# Altium integrated library Standardbauteile.IntLib: 132 symbols
Pins are listed as number, name and electrical type; pins without a type are passive.

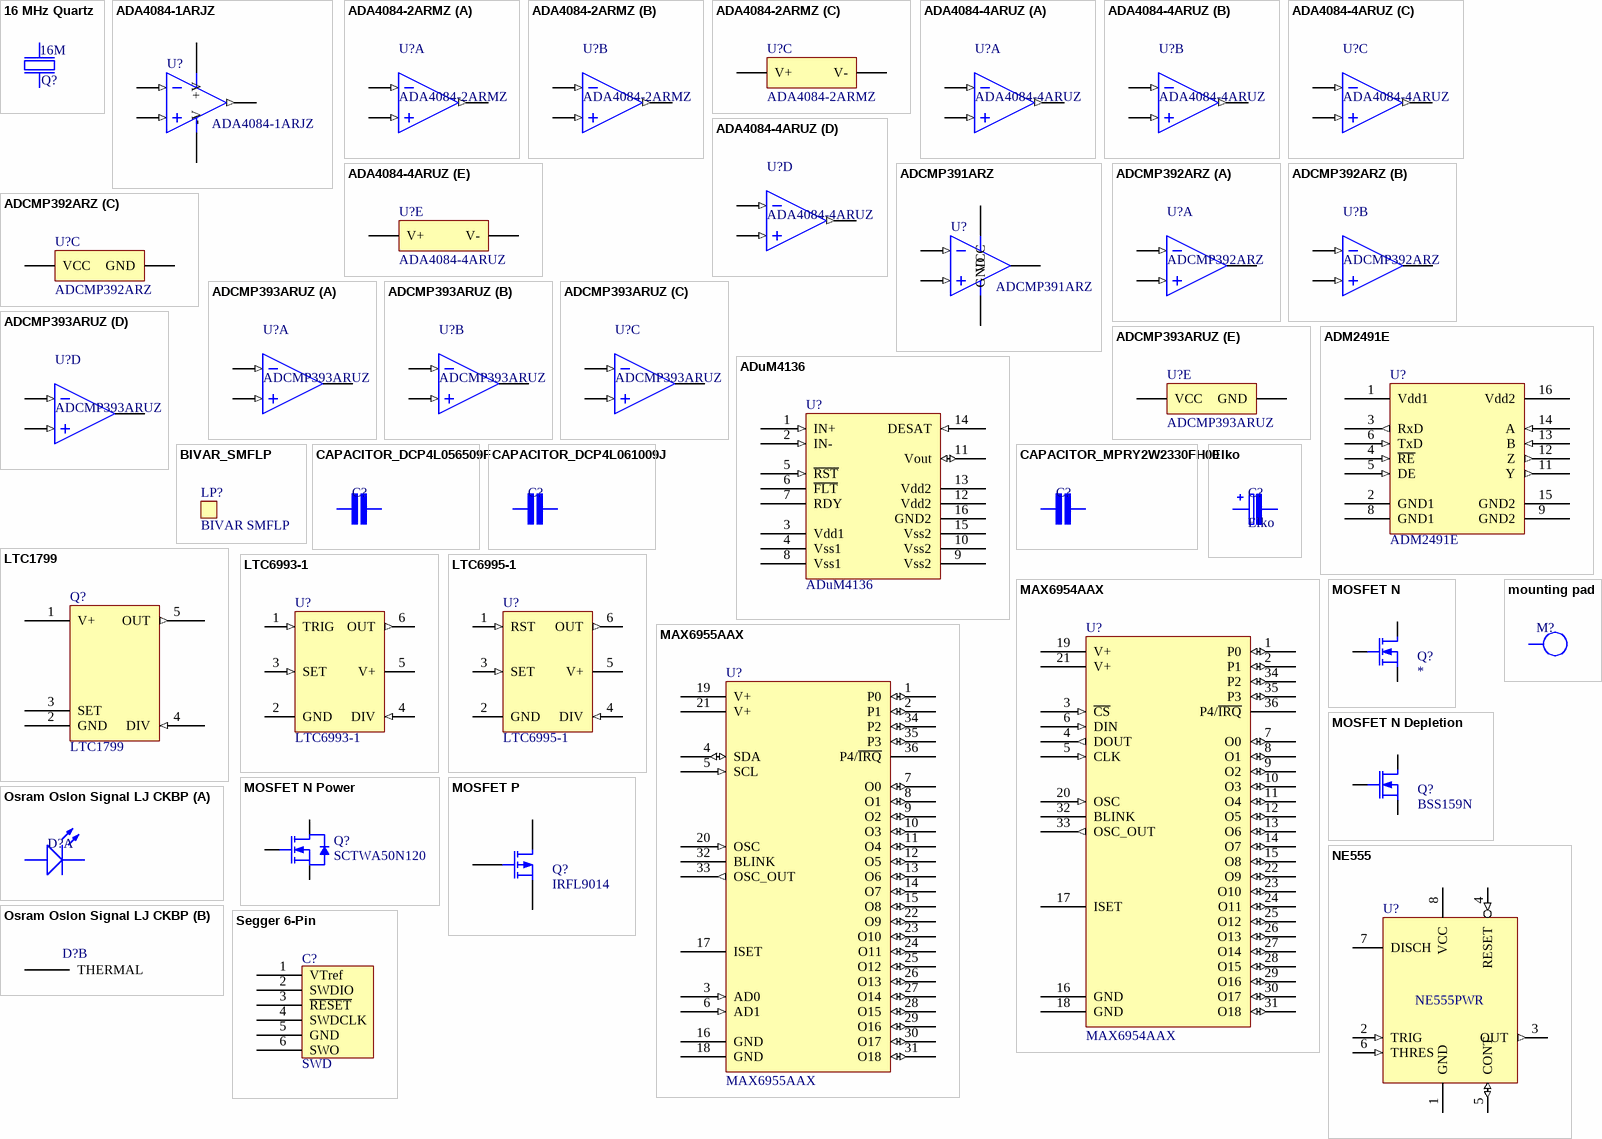
[diagram p0: symbols 16 MHz Quartz to Segger 6-Pin]

## 16 MHz Quartz
designator Q?, comment 16M
16 MHz Quartz
footprint NDK NX5032GA (Crystal, 2-Leads, Body 5.00x3.20mm, IPC Medium Density)
pins: 1, 2

## ADA4084-1ARJZ
designator U?
30 V, Low Noise, Rail-to-Rail Input/Output, Low Power Operational Amplifiers
footprint SOT-23-5-PIN
pins: 1 OUT (out), 2 -V (power), 3 +IN (in), 4 -IN (in), 5 +V (power)

## ADA4084-2ARMZ
designator U?
30 V, Low Noise, Rail-to-Rail Input/Output, Low Power Operational Amplifiers
footprint ANALOG_RM8 (Analog Devices 8-Lead Mini Small Outline Package)
part A pins: 1 OUT_A (out), 2 -IN_A (in), 3 +IN_A (in)
part B pins: 5 +IN_B (in), 6 -IN_B (in), 7 OUT_B (out)
part C pins: 4 V- (power), 8 V+ (power)

## ADA4084-4ARUZ
designator U?
30 V, Low Noise, Rail-to-Rail Input/Output, Low Power Operational Amplifiers
footprint ANALOG_RU14 (Analog Devices 14-Lead Thin Shrink Small Outline Package [TSSOP])
part A pins: 1 OUT_A (out), 2 -IN_A (in), 3 +IN_A (in)
part B pins: 5 +IN_B (in), 6 -IN_B (in), 7 OUT_B (out)
part C pins: 8 OUT_C (out), 9 -IN_C (in), 10 +IN_C (in)
part D pins: 12 +IN_D (in), 13 -IN_D (in), 14 OUT_D (out)
part E pins: 4 V+ (power), 11 V- (power)

## ADCMP391ARZ
designator U?
2.3V-5.5V Single Comparator With Known Power-Up State and Open-Drain output
footprint ANALOG_R8 (Analog Devices 8-Lead Standard Small Outline Package [SOIC_N])
pins: 2 -IN (in), 3 +IN (in), 4 GND (power), 6 OUT (oc), 7 VCC (power)

## ADCMP392ARZ
designator U?
2.3V-5.5V Dual Comparator With Known Power-Up State and Open-Drain outputs
footprint ANALOG_R8 (Analog Devices 8-Lead Standard Small Outline Package [SOIC_N])
part A pins: 1 OUT_A (oc), 2 -IN_A (in), 3 +IN_A (in)
part B pins: 5 +IN_B (in), 6 -IN_B (in), 7 OUT_B (oc)
part C pins: 4 GND (power), 8 VCC (power)

## ADCMP393ARUZ
designator U?
2.3V-5.5V Quad Comparator With Known Power-Up State and Open-Drain output
footprint ANALOG_RU14 (Analog Devices 14-Lead Thin Shrink Small Outline Package [TSSOP])
part A pins: 2 OUT_A (oc), 4 -IN_A (in), 5 +IN_A (in)
part B pins: 1 OUT_B (oc), 6 -IN_B (in), 7 +IN_B (in)
part C pins: 8 -IN_C (in), 9 +IN_C (in), 14 OUT_C (oc)
part D pins: 10 -IN_D (in), 11 +IN_D (in), 13 OUT_D (oc)
part E pins: 3 VCC (power), 12 GND (power)

## ADM2491E
designator U?
footprint SOIC16 (SOIC, 16-Leads, Body 10,30x7,50mm, Pitch 1,27mm, IPC Medium Density)
pins: 1 Vdd1 (power), 2 GND1 (power), 3 RxD (out), 4 ~{RE} (in), 5 DE (in), 6 TxD (in), 8 GND1 (power), 9 GND2 (power), 11 Y (out), 12 Z (out), 13 B (in), 14 A (in), 15 GND2 (power), 16 Vdd2 (power)

## ADuM4136
designator U?
footprint SOIC16 (SOIC, 16-Leads, Body 10,30x7,50mm, Pitch 1,27mm, IPC Medium Density)
pins: 1 IN+ (in), 2 IN- (in), 3 Vdd1 (power), 4 Vss1 (power), 5 ~{RST} (in), 6 ~{FLT} (oc), 7 RDY (oc), 8 Vss1 (power), 9 Vss2 (power), 10 Vss2 (power), 11 Vout (io), 12 Vdd2 (power), 13 Vdd2 (power), 14 DESAT (in), 15 Vss2 (power), 16 GND2 (power)

## BIVAR_SMFLP
designator LP?, comment BIVAR SMFLP  (mechanical)
footprint BIVAR_SMFLP (SMD flexible lightpipe)

## CAPACITOR_DCP4L056509F
designator C?, comment DCP4L056509F  (value not drawn)
WIMA MKP4 Capacitor 800V 65uF; Value: 65u; Datasheet: https://www.wima.de/wp-content/uploads/media/d_WIMA_DC_Link_MKP_4.pdf
footprint CAPACITOR_DCP4L056509F (WIMA MKP4 Capacitor)
pins: 1, 2

## CAPACITOR_DCP4L061009J
designator C?, comment DCP4L061009J  (value not drawn)
WIMA MKP4 Capacitor 800V 100uF; Value: 100u; Datasheet: https://www.wima.de/wp-content/uploads/media/d_WIMA_DC_Link_MKP_4.pdf
footprint CAPACITOR_DCP4L061009J (WIMA MKP4 Capacitor)
pins: 1, 2

## CAPACITOR_MPRY2W2330FH00
designator C?, comment MPRY2W2330FH00  (value not drawn)
WIMA MP 3-Y2 Capacitor 300V 22nF; Value: 22n; Datasheet: https://www.wima.de/wp-content/uploads/media/d_WIMA_MP_3-Y2_3R-Y2.pdf
footprint CAPACITOR_MPRY2W2330FH00 (WIMA MP3-Y2 Capacitor)
pins: 1, 2

## Elko
designator C?
footprint CAP ALUM 6.6MM (Aluminum Electrolytic Capacitor, Body 6.60x6.60x7.70mm, IPC Low Density)
footprint CAP ALUM 8.3MM (Aluminum Electrolytic Capacitor, Body 8.30x8.30x10.50mm, IPC Low Density)
footprint CAP ALUM 10.3MM (Aluminum Electrolytic Capacitor, Body 10.30x10.30x10.50mm, IPC Low Density)
pins: 1, 2

## LTC1799
designator Q?
1kHz to 3MHz Resistor Set Oscillator
footprint SOT-23-5-PIN
pins: 1 V+ (power), 2 GND (power), 3 SET (oc), 4 DIV (in), 5 OUT (out)

## LTC6993-1
designator U?
Monostable Pulse Generator (Rising Edge, No Retrigger)
footprint LT-S6-6-TSOT-23_L (SOT23, 6-Leads, Body 2.90x1.63mm, Pitch 0.95mm, IPC High Density)
pins: 1 TRIG (in) "Trigger Input. Depending on the version, a rising orfalling edge on TRIGwill initiate the output pulse.", 2 GND (power) "Ground. Tie to a lowinductance ground plane for best performance.", 3 SET (in) "Pulse Width Setting Input. The voltage on the SET pin (VSET) is regulated to 1V above GND. The amount of current sourced from the SET pin (ISET) programs the master oscillator frequency", 4 DIV (in) "Programmable Divider and Polarity Input. The DIV pin voltage (VDIV) is internally converted into a 4-bit result (DIVCODE). VDIV may be generated by a resistor divider between V+ and GND. Use 1% resistors to ensure an accurate result. The DIV pin and resistors should be shielded from the OUT pin or any other traces that have fast edges. Limit the capacitance on the DIV pin to less than 100pF so that VDIV settles quickly. The MSB of DIVCODE (POL) determines the polarity of the OUT pins. When POL = 0 the output produces a positive pulse. When POL = 1 the output produces a negative pulse.", 5 V+ (power) "SupplyVoltage (2.25Vto 5.5V). This supply should be kept free from noise and ripple. It should be bypassed directly to the GND pin with a 0.1uF capacitor.", 6 OUT (out) "Output. The OUT pin swings from GND to V+ with an output resistance of approximately 30Ohm. When driving an LED or other low impedance load a series output resistor should be used to limit source/sink current to 20mA."

## LTC6995-1
designator U?
Low Frequency Oscillator (active high RST)
footprint LT-S6-6-TSOT-23_L (SOT23, 6-Leads, Body 2.90x1.63mm, Pitch 0.95mm, IPC High Density)
pins: 1 RST (in) "Trigger Input. Depending on the version, a rising orfalling edge on TRIGwill initiate the output pulse.", 2 GND (power) "Ground. Tie to a lowinductance ground plane for best performance.", 3 SET (in) "Pulse Width Setting Input. The voltage on the SET pin (VSET) is regulated to 1V above GND. The amount of current sourced from the SET pin (ISET) programs the master oscillator frequency", 4 DIV (in) "Programmable Divider and Polarity Input. The DIV pin voltage (VDIV) is internally converted into a 4-bit result (DIVCODE). VDIV may be generated by a resistor divider between V+ and GND. Use 1% resistors to ensure an accurate result. The DIV pin and resistors should be shielded from the OUT pin or any other traces that have fast edges. Limit the capacitance on the DIV pin to less than 100pF so that VDIV settles quickly. The MSB of DIVCODE (POL) determines the polarity of the OUT pins. When POL = 0 the output produces a positive pulse. When POL = 1 the output produces a negative pulse.", 5 V+ (power) "SupplyVoltage (2.25Vto 5.5V). This supply should be kept free from noise and ripple. It should be bypassed directly to the GND pin with a 0.1uF capacitor.", 6 OUT (out) "Output. The OUT pin swings from GND to V+ with an output resistance of approximately 30Ohm. When driving an LED or other low impedance load a series output resistor should be used to limit source/sink current to 20mA."

## MAX6954AAX
designator U?
4-Wire Interfaced, 2.7V to 5.5V / LED Display Driver with I/O / Expander and Key Scan; ComponentLink1Description: Datasheet; ComponentLink1URL: https://datasheets.maximintegrated.com/en/ds/MAX6954.pdf; ComponentLink2Description: Website; ComponentLink2URL: https://www.maximintegrated.com/en/products/power/display-power-control/MAX6954.html
footprint MAXIM_36_SSOP (Maxim Integrated A36-2  36 SSOP)
pins: 1 P0 (io), 2 P1 (io), 3 ~{CS} (in), 4 DOUT (out), 5 CLK (in), 6 DIN (in), 7 O0 (io), 8 O1 (io), 9 O2 (io), 10 O3 (io), 11 O4 (io), 12 O5 (io), 13 O6 (io), 14 O7 (io), 15 O8 (io), 16 GND (power), 17 ISET (oe), 18 GND (power), 19 V+ (power), 20 OSC (in), 21 V+ (power), 22 O9 (io), 23 O10 (io), 24 O11 (io), 25 O12 (io), 26 O13 (io), 27 O14 (io), 28 O15 (io), 29 O16 (io), 30 O17 (io), 31 O18 (io), 32 BLINK (oc), 33 OSC_OUT (out), 34 P2 (io), 35 P3 (io), 36 P4/~{IRQ} (oc)

## MAX6955AAX
designator U?
2-Wire Interfaced, 2.7V to 5.5V / LED Display Driver with I/O / Expander and Key Scan; ComponentLink1Description: Datasheet; ComponentLink1URL: https://datasheets.maximintegrated.com/en/ds/MAX6955.pdf; ComponentLink2Description: Website; ComponentLink2URL: https://www.maximintegrated.com/en/products/power/display-power-control/MAX6955.html
footprint MAXIM_36_SSOP (Maxim Integrated A36-2  36 SSOP)
pins: 1 P0 (io), 2 P1 (io), 3 AD0 (in), 4 SDA (io), 5 SCL (in), 6 AD1 (in), 7 O0 (io), 8 O1 (io), 9 O2 (io), 10 O3 (io), 11 O4 (io), 12 O5 (io), 13 O6 (io), 14 O7 (io), 15 O8 (io), 16 GND (power), 17 ISET (oe), 18 GND (power), 19 V+ (power), 20 OSC (in), 21 V+ (power), 22 O9 (io), 23 O10 (io), 24 O11 (io), 25 O12 (io), 26 O13 (io), 27 O14 (io), 28 O15 (io), 29 O16 (io), 30 O17 (io), 31 O18 (io), 32 BLINK (oc), 33 OSC_OUT (out), 34 P2 (io), 35 P3 (io), 36 P4/~{IRQ} (oc)

## MOSFET N
designator Q?
N-Channel MOSFET / RK7002BMT116: / 250mA, 60Vds, 20Vgs / IRLML0100TR: / 1.6A, 100Vds, 16Vgs
footprint SOT23 (SOT23, 3-Leads, Body 2,90x2,45mm, Pitch 0,95mm, IPC Medium Density)
pins: 1 G, 2 S, 3 D

## MOSFET N Depletion
designator Q?, comment BSS159N
N-Channel MOSFET
footprint SOT23 (SOT23, 3-Leads, Body 2,90x2,45mm, Pitch 0,95mm, IPC Medium Density)
pins: 1 G, 2 S, 3 D

## MOSFET N Power
designator Q?, comment SCTWA50N120
SiC N-Channel MOSFET
footprint HiP247
footprint TO-247_flat_faceup
footprint TO-263 (D2-PAK, 4-Leads, Body 9.2x10.2mm, Pitch 2.54mm, Lead Span 15.4mm, IPC High Density); pin to pad 2>4
pins: 1 G, 2 D, 3 S

## MOSFET P
designator Q?, comment IRFL9014
P-Channel MOSFET
footprint SOT223-IRFL9014 (SOT223, 4-Leads, Body 6,50x7,00mm (avg), Pitch 2,30mm, IPC Medium Density); pin to pad 1>D 2>G 3>S
pins: 1 D, 2 G, 3 S

## mounting pad
designator M?  (no BOM)
mounting pad
footprint MOUNTING_PAD_M4 (M4 mounting pad)
footprint MOUNTING_PAD_M3 (M3 mounting pad)
pins: 1

## NE555
designator U?, comment NE555PWR
footprint 8-TSSOP (TSOP, 8-Leads, Body 3,00x4,40mm, Pitch 0,65mm, IPC Low Density)
pins: 1 GND (power), 2 TRIG (in), 3 OUT (out), 4 RESET (in), 5 CONT (io), 6 THRES (in), 7 DISCH (oc), 8 VCC (power)

## Osram Oslon Signal LJ CKBP
designator D?
footprint OSLON Signal LJ CKBP
part A pins: A Anode, C Cathode
part B pins: THERMAL

## Segger 6-Pin
designator C?, comment SWD  (no BOM)
footprint SEGGER_6_PIN
pins: 1 VTref, 2 SWDIO, 3 ~{RESET}, 4 SWDCLK, 5 GND, 6 SWO

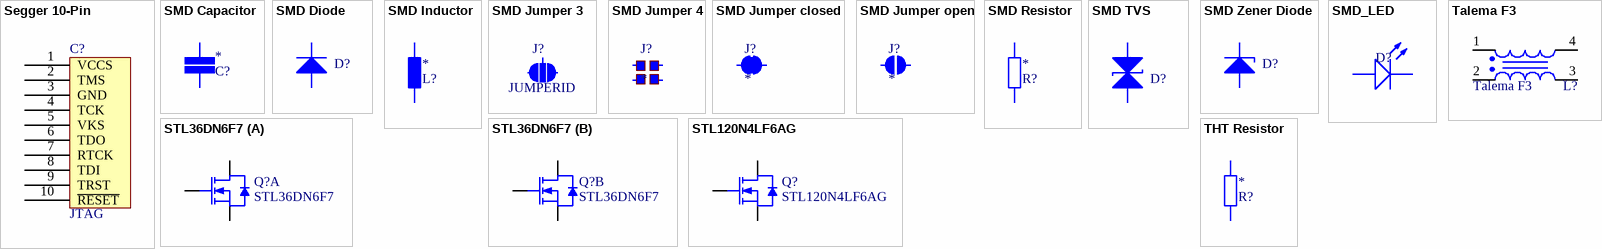
[diagram p1: symbols Segger 10-Pin to THT Resistor]

## Segger 10-Pin
designator C?, comment JTAG  (no BOM)
footprint SEGGER_10_PIN
pins: 1 VCCS, 2 TMS, 3 GND, 4 TCK, 5 VKS, 6 TDO, 7 RTCK, 8 TDI, 9 TRST, 10 ~{RESET}

## SMD Capacitor
designator C?
Capacitor with multiple Footprints; Value: *
footprint CAP 0603/1608 (Chip Capacitor, 2-Leads, Body 1.60x0.80mm, IPC Medium Density)
footprint CAP 0805/2012 (Chip Capacitor, 2-Leads, Body 2.00x1.20mm, IPC Medium Density)
footprint CAP 1206/3216 (Chip Capacitor, 2-Leads, Body 3.25x1.60mm, IPC Medium Density)
pins: 1, 2

## SMD Diode
designator D?  (value not drawn)
footprint DO214AA SMB (Molded Diode, 2-Leads, Body 4.31x3.62mm, IPC Medium Density); pin to pad A>1 C>2
footprint DO214AB SMC (Molded Diode, 2-Leads, Body 6.85x5.90mm, IPC Medium Density); pin to pad A>1 C>2
footprint DO214AC SMA (Molded Diode, 2-Leads, Body 4.30x2.60mm, IPC Medium Density); pin to pad A>1 C>2
footprint SMBFLAT (Molded Diode, 2-Leads, Body 5.1x3.3mm, IPC Medium Density)
footprint DO214BA GF1 (Molded, 2-Leads, Body 4.57x3.94mm, IPC High Density)
footprint SOT23 (SOT23, 3-Leads, Body 2,90x2,45mm, Pitch 0,95mm, IPC Medium Density); pin to pad A>1 C>3
footprint SOD123F (SODFL, 2-Leads, Body 1.60x3.50mm, IPC Medium Density); pin to pad A>1 C>2
footprint SOD323F (SODFL, 2-Leads, Body 1.25x2.50mm, IPC Medium Density); pin to pad A>1 C>2
pins: A, C

## SMD Inductor
designator L?
Value: *
footprint SMD-Inductor 1206 (Chip Inductor, 1206)
footprint STACKPOLE CSR0402 (Chip Resistor, 2-Leads, Body 1.0x0.5mm, IPC Medium Density)
footprint STACKPOLE CSR0603 (Chip Resistor, 2-Leads, Body 1.60x0.80mm, IPC Medium Density)
footprint STACKPOLE CSR0805 (Chip Resistor, 2-Leads, Body 2.00x1.25mm, IPC Medium Density)
pins: 1, 2

## SMD Jumper 3
designator J?, comment JUMPERID  (net tie, no BOM)
footprint SMD-JUMPER-3 (Jumper, SMD)
pins: 1, 2, 3

## SMD Jumper 4
designator J?  (no BOM)
footprint SMD-JUMPER-QUAD (Jumper, SMD)
pins: 1, 2, 3, 4

## SMD Jumper closed
designator J?  (net tie, no BOM)
footprint SMD-JUMPER-CLOSED (Jumper, SMD)
pins: 1, 2

## SMD Jumper open
designator J?  (no BOM)
footprint SMD-JUMPER-OPEN (Jumper, SMD)
pins: 1, 2

## SMD Resistor
designator R?
Resistor with multiple footprints; Value: *
footprint STACKPOLE CSR0603 (Chip Resistor, 2-Leads, Body 1.60x0.80mm, IPC Medium Density)
footprint STACKPOLE CSR0805 (Chip Resistor, 2-Leads, Body 2.00x1.25mm, IPC Medium Density)
footprint STACKPOLE CSR1206 (Chip Resistor, 2-Leads, Body 3.13x1.55mm, IPC Medium Density)
footprint STACKPOLE CSRN2512 (Chip Resistor, 2-Leads, Body 6.40x3.20mm, IPC Medium Density)
pins: 1, 2

## SMD TVS
designator D?, comment SMBJ33CA  (value not drawn)
Transient Voltage Suppression Diodes
footprint DO214AA SMB (Molded Diode, 2-Leads, Body 4.31x3.62mm, IPC Medium Density); pin to pad A>1 C>2
footprint DO214AB SMC (Molded Diode, 2-Leads, Body 6.85x5.90mm, IPC Medium Density); pin to pad A>1 C>2
footprint DO214AC SMA (Molded Diode, 2-Leads, Body 4.30x2.60mm, IPC Medium Density); pin to pad A>1 C>2
footprint SMBFLAT (Molded Diode, 2-Leads, Body 5.1x3.3mm, IPC Medium Density)
footprint DO214BA GF1 (Molded, 2-Leads, Body 4.57x3.94mm, IPC High Density)
footprint SOT23 (SOT23, 3-Leads, Body 2,90x2,45mm, Pitch 0,95mm, IPC Medium Density); pin to pad A>1 C>3
pins: A, C

## SMD Zener Diode
designator D?  (value not drawn)
footprint SOT23 (SOT23, 3-Leads, Body 2,90x2,45mm, Pitch 0,95mm, IPC Medium Density); pin to pad A>1 C>3
pins: A, C

## SMD_LED
designator D?
footprint SOT-23 - LED
pins: A Anode, C Cathode

## STL36DN6F7
designator Q?
Dual N-channel 60 V, 23 mΩ typ., 33 A
footprint STM_PowerFLAT_5x6_NFET_double_island
part A pins: D1, G1, S1
part B pins: D2, G2, S2

## STL120N4LF6AG
designator Q?
Automotive-grade N-channel 40 V, 3.0 mΩ typ., 55 A
footprint STM_PowerFLAT_5x6_NFET
pins: D, G, S

## Talema F3
designator L?
footprint TALEMA_F3 (Talema/Nuvotem common mode choke)
pins: 1, 2, 3, 4

## THT Resistor
designator R?
Value: *
footprint HV_THT_RESISTOR
footprint RESISTOR_HS25 (Power resistor by arcol)
footprint OHMITE_TUM15 (Ceramic Housed Axial Terminal Power Resistor)
footprint YAGEO_HHV_25
pins: 1, 2


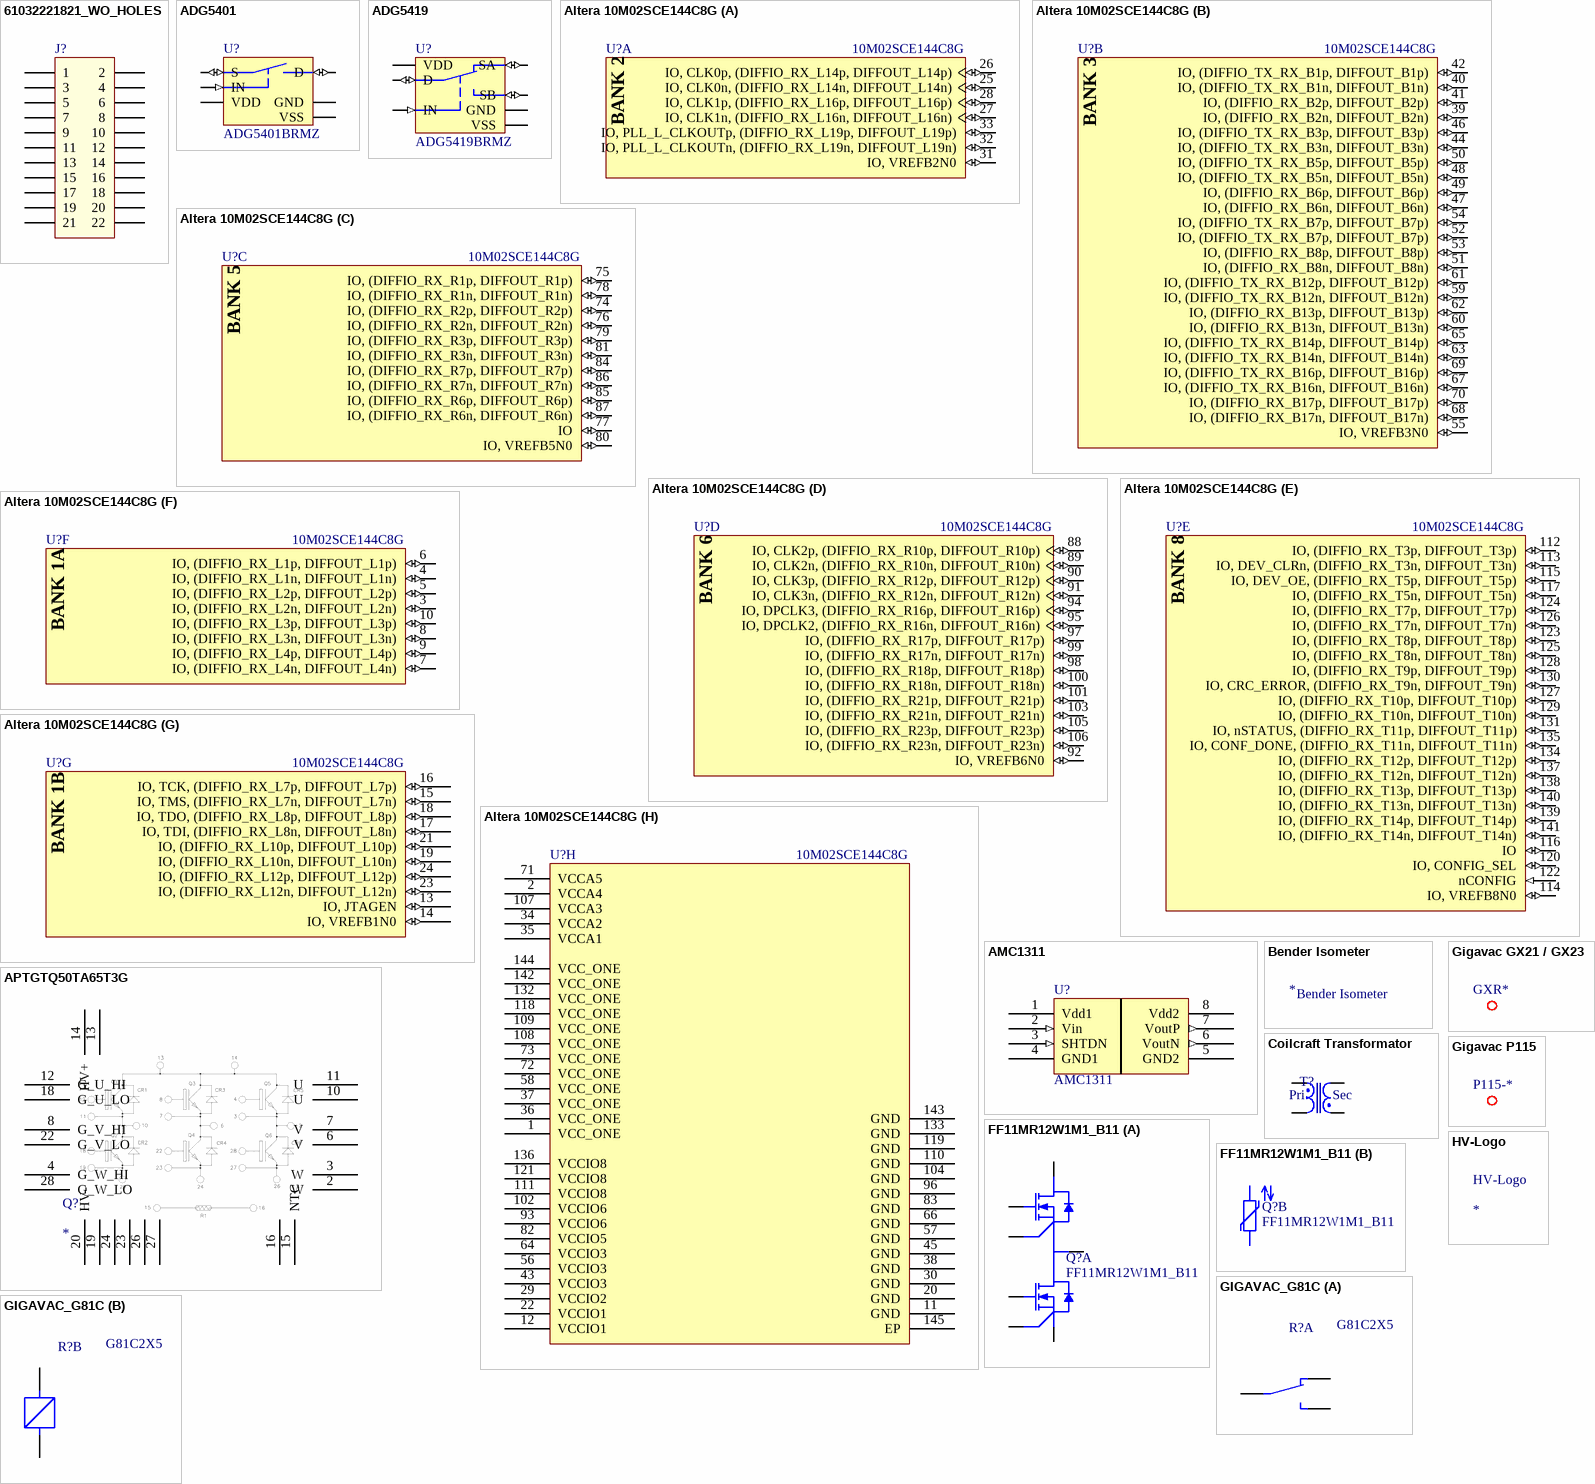
[diagram p2: symbols 61032221821_WO_HOLES to HV-Logo]

## 61032221821_WO_HOLES
designator J?
WR-PHD 2.54 mm Dual SMT Socket Header, 22p; Part Number: 61032221821; Pin Number: 22; Rated Current: 3A; Working Voltage: 250V AC; Withstanding Voltage: 600V AC; Pitch: 2.54mm; ComponentLink1Description: Manufacturer; ComponentLink1URL: http://www.we-online.de; ComponentLink2Description: Datasheet; ComponentLink2URL: http://katalog.we-online.de/em/datasheet/6103xx21821.pdf; Published Date: August 2017; Publisher: Wurth Elektronik
footprint 61032221821_WO_HOLES (Dual SMT Socket Header, pitch 2.54mm, 22p, without holes)
pins: 1, 2, 3, 4, 5, 6, 7, 8, 9, 10, 11, 12, 13, 14, 15, 16, 17, 18, 19, 20, 21, 22

## ADG5401
designator U?, comment ADG5401BRMZ
High Voltage Latch-Up Proof, Single SPST Switch / ±9 V to ±22 V dual-supply operation / 9 V to 40 V single-supply operation; ComponentLink1Description: Webpage; ComponentLink1URL: https://www.analog.com/en/products/adg5401.html; ComponentLink2Description: Datasheet; ComponentLink2URL: https://www.analog.com/media/en/technical-documentation/data-sheets/ADG5401.pdf
footprint ANALOG_RM8 (Analog Devices 8-Lead Mini Small Outline Package [MSOP])
pins: 1 S (io), 3 GND (power), 4 VDD (power), 6 IN (in), 7 VSS (power), 8 D (io)

## ADG5419
designator U?, comment ADG5419BRMZ
High Voltage Latch-Up Proof, Single SPDT Switch / ±9 V to ±22 V dual-supply operation / 9 V to 40 V single-supply operation; ComponentLink1Description: Webpage; ComponentLink1URL: https://www.analog.com/en/products/adg5401.html; ComponentLink2Description: Datasheet; ComponentLink2URL: https://www.analog.com/media/en/technical-documentation/data-sheets/ADG5401.pdf
footprint ANALOG_RM8 (Analog Devices 8-Lead Mini Small Outline Package [MSOP])
pins: 1 D (io), 2 SA (io), 3 GND (power), 4 VDD (power), 6 IN (in), 7 VSS (power), 8 SB (io)

## Altera 10M02SCE144C8G
designator U?, comment 10M02SCE144C8G
FPGA, 101 I/O, 2000LE, single power supply
footprint Altera EQFP144 (SQFP, 144-Leads, Body 20,00x20,00mm, Pitch 0,50mm, Thermal Pad 4,15x4,15mm, IPC Low Density)
part A pins: 25 IO, CLK0n, (DIFFIO_RX_L14n, DIFFOUT_L14n) (io), 26 IO, CLK0p, (DIFFIO_RX_L14p, DIFFOUT_L14p) (io), 27 IO, CLK1n, (DIFFIO_RX_L16n, DIFFOUT_L16n) (io), 28 IO, CLK1p, (DIFFIO_RX_L16p, DIFFOUT_L16p) (io), 31 IO, VREFB2N0 (io), 32 IO, PLL_L_CLKOUTn, (DIFFIO_RX_L19n, DIFFOUT_L19n) (io), 33 IO, PLL_L_CLKOUTp, (DIFFIO_RX_L19p, DIFFOUT_L19p) (io)
part B pins: 39 IO, (DIFFIO_RX_B2n, DIFFOUT_B2n) (io), 40 IO, (DIFFIO_TX_RX_B1n, DIFFOUT_B1n) (io), 41 IO, (DIFFIO_RX_B2p, DIFFOUT_B2p) (io), 42 IO, (DIFFIO_TX_RX_B1p, DIFFOUT_B1p) (io), 44 IO, (DIFFIO_TX_RX_B3n, DIFFOUT_B3n) (io), 46 IO, (DIFFIO_TX_RX_B3p, DIFFOUT_B3p) (io), 47 IO, (DIFFIO_RX_B6n, DIFFOUT_B6n) (io), 48 IO, (DIFFIO_TX_RX_B5n, DIFFOUT_B5n) (io), 49 IO, (DIFFIO_RX_B6p, DIFFOUT_B6p) (io), 50 IO, (DIFFIO_TX_RX_B5p, DIFFOUT_B5p) (io), 51 IO, (DIFFIO_RX_B8n, DIFFOUT_B8n) (io), 52 IO, (DIFFIO_TX_RX_B7p, DIFFOUT_B7p) (io), 53 IO, (DIFFIO_RX_B8p, DIFFOUT_B8p) (io), 54 IO, (DIFFIO_TX_RX_B7p, DIFFOUT_B7p) (io), 55 IO, VREFB3N0 (io), 59 IO, (DIFFIO_TX_RX_B12n, DIFFOUT_B12n) (io), 60 IO, (DIFFIO_RX_B13n, DIFFOUT_B13n) (io), 61 IO, (DIFFIO_TX_RX_B12p, DIFFOUT_B12p) (io), 62 IO, (DIFFIO_RX_B13p, DIFFOUT_B13p) (io), 63 IO, (DIFFIO_TX_RX_B14n, DIFFOUT_B14n) (io), 65 IO, (DIFFIO_TX_RX_B14p, DIFFOUT_B14p) (io), 67 IO, (DIFFIO_TX_RX_B16n, DIFFOUT_B16n) (io), 68 IO, (DIFFIO_RX_B17n, DIFFOUT_B17n) (io), 69 IO, (DIFFIO_TX_RX_B16p, DIFFOUT_B16p) (io), 70 IO, (DIFFIO_RX_B17p, DIFFOUT_B17p) (io)
part C pins: 74 IO, (DIFFIO_RX_R2p, DIFFOUT_R2p) (io), 75 IO, (DIFFIO_RX_R1p, DIFFOUT_R1p) (io), 76 IO, (DIFFIO_RX_R2n, DIFFOUT_R2n) (io), 77 IO (io), 78 IO, (DIFFIO_RX_R1n, DIFFOUT_R1n) (io), 79 IO, (DIFFIO_RX_R3p, DIFFOUT_R3p) (io), 80 IO, VREFB5N0 (io), 81 IO, (DIFFIO_RX_R3n, DIFFOUT_R3n) (io), 84 IO, (DIFFIO_RX_R7p, DIFFOUT_R7p) (io), 85 IO, (DIFFIO_RX_R6p, DIFFOUT_R6p) (io), 86 IO, (DIFFIO_RX_R7n, DIFFOUT_R7n) (io), 87 IO, (DIFFIO_RX_R6n, DIFFOUT_R6n) (io)
part D pins: 88 IO, CLK2p, (DIFFIO_RX_R10p, DIFFOUT_R10p) (io), 89 IO, CLK2n, (DIFFIO_RX_R10n, DIFFOUT_R10n) (io), 90 IO, CLK3p, (DIFFIO_RX_R12p, DIFFOUT_R12p) (io), 91 IO, CLK3n, (DIFFIO_RX_R12n, DIFFOUT_R12n) (io), 92 IO, VREFB6N0 (io), 94 IO, DPCLK3, (DIFFIO_RX_R16p, DIFFOUT_R16p) (io), 95 IO, DPCLK2, (DIFFIO_RX_R16n, DIFFOUT_R16n) (io), 97 IO, (DIFFIO_RX_R17p, DIFFOUT_R17p) (io), 98 IO, (DIFFIO_RX_R18p, DIFFOUT_R18p) (io), 99 IO, (DIFFIO_RX_R17n, DIFFOUT_R17n) (io), 100 IO, (DIFFIO_RX_R18n, DIFFOUT_R18n) (io), 101 IO, (DIFFIO_RX_R21p, DIFFOUT_R21p) (io), 103 IO, (DIFFIO_RX_R21n, DIFFOUT_R21n) (io), 105 IO, (DIFFIO_RX_R23p, DIFFOUT_R23p) (io), 106 IO, (DIFFIO_RX_R23n, DIFFOUT_R23n) (io)
part E pins: 112 IO, (DIFFIO_RX_T3p, DIFFOUT_T3p) (io), 113 IO, DEV_CLRn, (DIFFIO_RX_T3n, DIFFOUT_T3n) (io), 114 IO, VREFB8N0 (io), 115 IO, DEV_OE, (DIFFIO_RX_T5p, DIFFOUT_T5p) (io), 116 IO (io), 117 IO, (DIFFIO_RX_T5n, DIFFOUT_T5n) (io), 120 IO, CONFIG_SEL (io), 122 nCONFIG (in), 123 IO, (DIFFIO_RX_T8p, DIFFOUT_T8p) (io), 124 IO, (DIFFIO_RX_T7p, DIFFOUT_T7p) (io), 125 IO, (DIFFIO_RX_T8n, DIFFOUT_T8n) (io), 126 IO, (DIFFIO_RX_T7n, DIFFOUT_T7n) (io), 127 IO, (DIFFIO_RX_T10p, DIFFOUT_T10p) (io), 128 IO, (DIFFIO_RX_T9p, DIFFOUT_T9p) (io), 129 IO, (DIFFIO_RX_T10n, DIFFOUT_T10n) (io), 130 IO, CRC_ERROR, (DIFFIO_RX_T9n, DIFFOUT_T9n) (io), 131 IO, nSTATUS, (DIFFIO_RX_T11p, DIFFOUT_T11p) (io), 134 IO, (DIFFIO_RX_T12p, DIFFOUT_T12p) (io), 135 IO, CONF_DONE, (DIFFIO_RX_T11n, DIFFOUT_T11n) (io), 137 IO, (DIFFIO_RX_T12n, DIFFOUT_T12n) (io), 138 IO, (DIFFIO_RX_T13p, DIFFOUT_T13p) (io), 139 IO, (DIFFIO_RX_T14p, DIFFOUT_T14p) (io), 140 IO, (DIFFIO_RX_T13n, DIFFOUT_T13n) (io), 141 IO, (DIFFIO_RX_T14n, DIFFOUT_T14n) (io)
part F pins: 3 IO, (DIFFIO_RX_L2n, DIFFOUT_L2n) (io), 4 IO, (DIFFIO_RX_L1n, DIFFOUT_L1n) (io), 5 IO, (DIFFIO_RX_L2p, DIFFOUT_L2p) (io), 6 IO, (DIFFIO_RX_L1p, DIFFOUT_L1p) (io), 7 IO, (DIFFIO_RX_L4n, DIFFOUT_L4n) (io), 8 IO, (DIFFIO_RX_L3n, DIFFOUT_L3n) (io), 9 IO, (DIFFIO_RX_L4p, DIFFOUT_L4p) (io), 10 IO, (DIFFIO_RX_L3p, DIFFOUT_L3p) (io)
part G pins: 13 IO, JTAGEN (io), 14 IO, VREFB1N0 (io), 15 IO, TMS, (DIFFIO_RX_L7n, DIFFOUT_L7n) (io), 16 IO, TCK, (DIFFIO_RX_L7p, DIFFOUT_L7p) (io), 17 IO, TDI, (DIFFIO_RX_L8n, DIFFOUT_L8n) (io), 18 IO, TDO, (DIFFIO_RX_L8p, DIFFOUT_L8p) (io), 19 IO, (DIFFIO_RX_L10n, DIFFOUT_L10n) (io), 21 IO, (DIFFIO_RX_L10p, DIFFOUT_L10p) (io), 23 IO, (DIFFIO_RX_L12n, DIFFOUT_L12n) (io), 24 IO, (DIFFIO_RX_L12p, DIFFOUT_L12p) (io)
part H pins: 1 VCC_ONE (power), 2 VCCA4 (power), 11 GND (power), 12 VCCIO1 (power), 20 GND (power), 22 VCCIO1 (power), 29 VCCIO2 (power), 30 GND (power), 34 VCCA2 (power), 35 VCCA1 (power), 36 VCC_ONE (power), 37 VCC_ONE (power), 38 GND (power), 43 VCCIO3 (power), 45 GND (power), 56 VCCIO3 (power), 57 GND (power), 58 VCC_ONE (power), 64 VCCIO3 (power), 66 GND (power), 71 VCCA5 (power), 72 VCC_ONE (power), 73 VCC_ONE (power), 82 VCCIO5 (power), 83 GND (power), 93 VCCIO6 (power), 96 GND (power), 102 VCCIO6 (power), 104 GND (power), 107 VCCA3 (power), 108 VCC_ONE (power), 109 VCC_ONE (power), 110 GND (power), 111 VCCIO8 (power), 118 VCC_ONE (power), 119 GND (power), 121 VCCIO8 (power), 132 VCC_ONE (power), 133 GND (power), 136 VCCIO8 (power), 142 VCC_ONE (power), 143 GND (power), 144 VCC_ONE (power), 145 EP (power)
part A text: BANK 2
part B text: BANK 3
part C text: BANK 5
part D text: BANK 6
part E text: BANK 8
part F text: BANK 1A
part G text: BANK 1B

## AMC1311
designator U?
Precision Reinforced Isolated Amplifier for Voltage Sensing
footprint SOIC8W (SOIC, 8-Leads, Body 5,85mm x 7,50mm, Pitch 1,27mm, IPC Medium Density)
pins: 1 Vdd1 (power), 2 Vin (in), 3 SHTDN (in), 4 GND1 (power), 5 GND2 (power), 6 VoutN (out), 7 VoutP (out), 8 Vdd2 (power)

## APTGTQ50TA65T3G
designator Q?
footprint SP3F
pins: 2 W, 3 W, 4 G_W_HI, 6 V, 7 V, 8 G_V_HI, 10 U, 11 U, 12 G_U_HI, 13 HV+, 14 HV+, 15 NTC, 16 NTC, 18 G_U_LO, 19 U_HV-, 20 HV-, 22 G_V_LO, 23 V_HV-, 24 V_HV-, 26 W_HV-, 27 W_HV-, 28 G_W_LO

## Bender Isometer
designator Bender Isometer
footprint Bender Isometer (Placeholder for Bender Isometer)

## Coilcraft Transformator
designator T?, comment Coilcraft MA5421-AL  (value not drawn)
Coilcraft Transformator 3.4uH 1:1; Order Nr.: 750312504; Hersteller: Würth
footprint MA5421-AL (Coilcraft MA5421-AL)
pins: 1, 5, 6, 10
text: Pri; Sec

## FF11MR12W1M1_B11
designator Q?
SiC Halfbridge
footprint FF11MR12W1M1_B11 (Infineon EasyDUAL package for FF11MR12W1M1_B11)
part A pins: DC+, DC-, G_HS, G_LS, PHASE, S_HS, S_LS
part B pins: NTC_1, NTC_2

## Gigavac GX21 / GX23
designator GXR*  (value not drawn)
footprint Gigavac GX21

## Gigavac P115
designator P115-*  (value not drawn)
footprint Gigavac P115

## GIGAVAC_G81C
designator R?, comment G81C2X5
10kV SPDT HV Relay / Single Pole Double Throw / 12V  coil / X=3 for pins, 4 for wires
footprint GIGAVAC_G81C
footprint GIGAVAC_G81C_wired
part A pins: 1 NO, 2 NC, 3 COM
part B pins: L1, L2

## HV-Logo
designator HV-Logo
footprint HV-Logo
